# Altium footprint library JL_PCB.PCBLIB: 1112 footprints (part 9 of 71)
Each footprint in its own frame and in the unit in brackets; x right, y up, seen from the top. Pads: shape width x height; smd on the part's side, far side on the other; paste and mask are expansions set on the pad; w line width, h text height; cw(c..) or ccw(c..) is an arc to the next point about the centre after c.
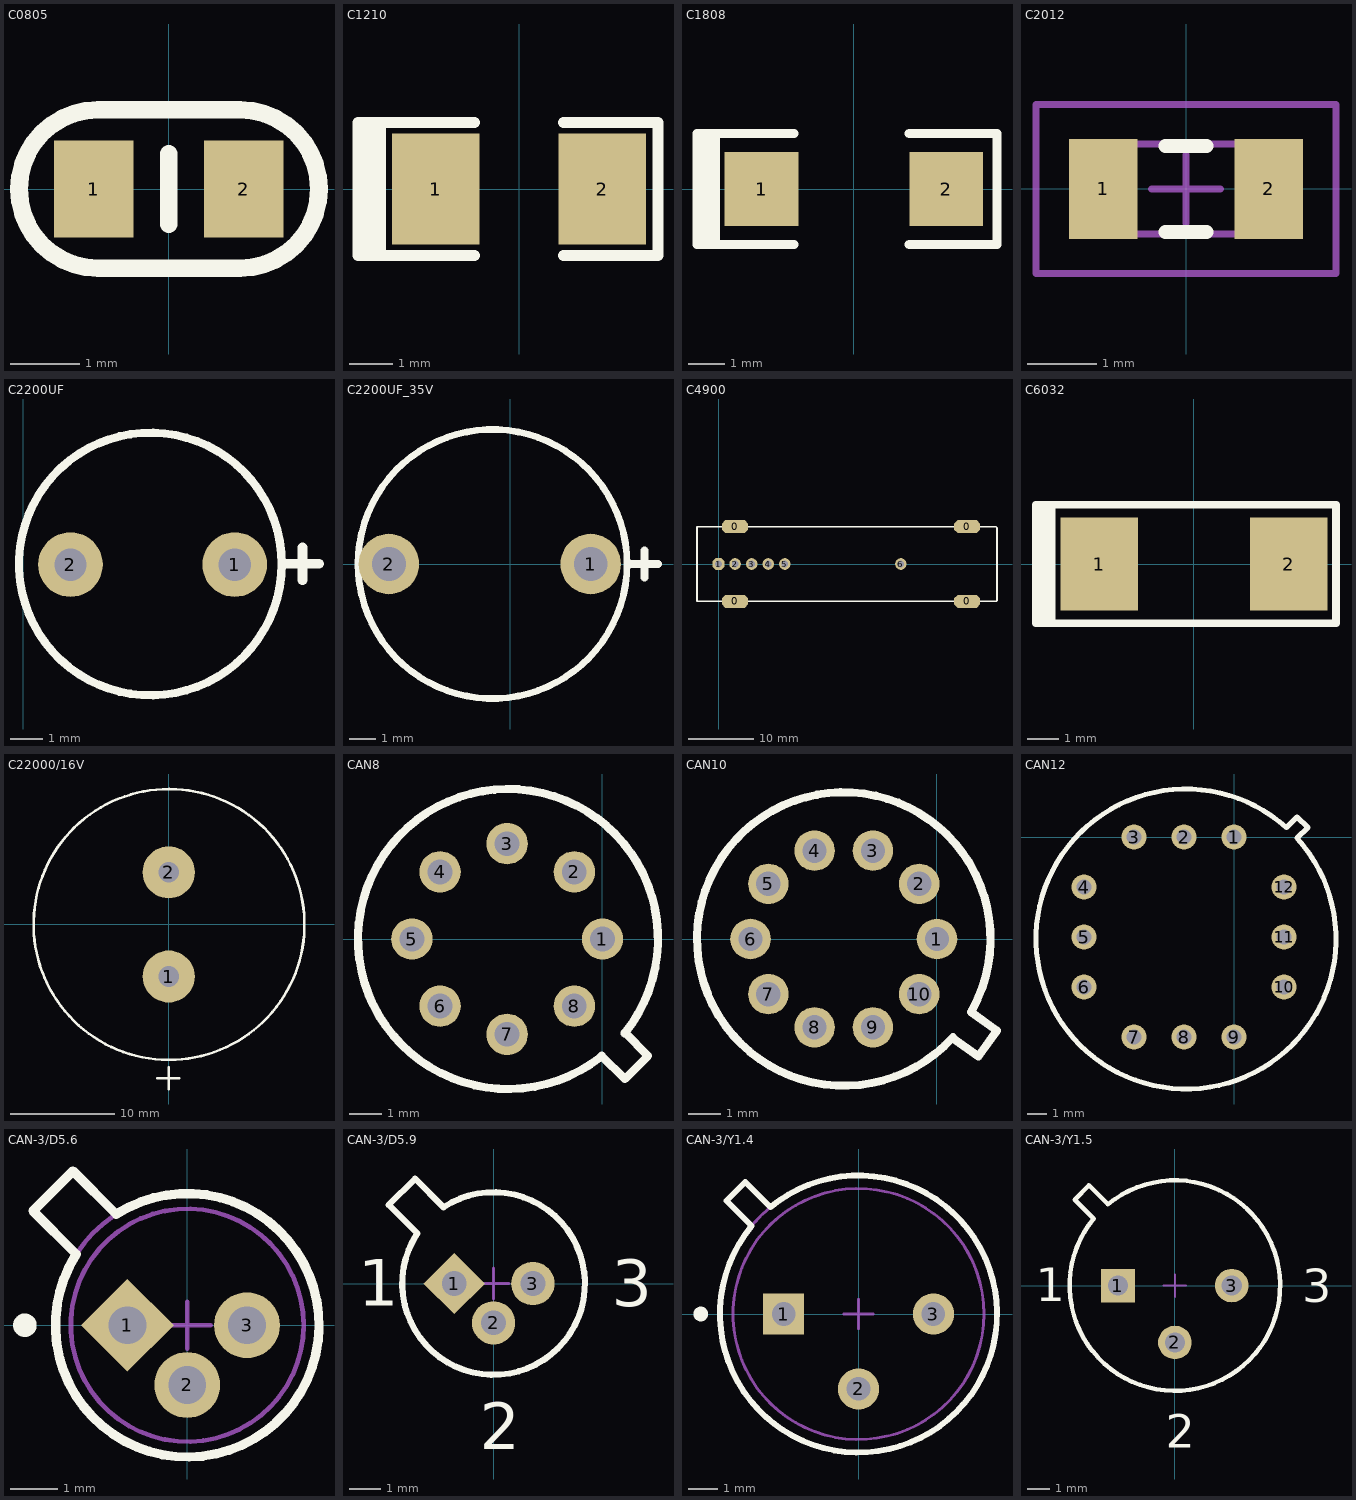
[diagram p8: the footprints below, top view; thin cyan lines are the x and y axes]

## C0805 [mil]
pads (2):
  rect 45x55 smd: 1(-42.5,0) 2(42.5,0)
TopOverlay:
  lines w10: 0,-20 0,20 ; -40,-45 cw(c-40,0) -40,45 40.25,45 cw(c40.25,0) 40.25,-45 -40,-45

## C1210 [mm]
pads (2):
  rect 2x2.54 smd: 1(-1.905,0) 2(1.905,0)
TopOverlay:
  lines w0.254: -3.429,-1.524 -3.429,1.524 ; -3.175,-1.524 -3.175,1.524 ; -1.016,-1.524 -3.683,-1.524 -3.683,1.524 -1.016,1.524 ; 1.016,-1.524 3.175,-1.524 3.175,1.524 1.016,1.524

## C1808 [mil]
pads (2):
  rect 80x80 smd: 1(-100,0) 2(100,0)
TopOverlay:
  lines w10: -160,-60 -160,60 ; -150,-55 -150,60 ; -65,-60 -170,-60 -170,60 -65,60 ; 60,-60 155,-60 155,60 60,60

## C2012 [mm] "Chip Capacitor, 2-Leads, Body 2.0x1.2mm, IPC Low Density"
height 0.6
pads (2):
  rect 1x1.45 smd: 1(-1.2,0) 2(1.2,0)
TopOverlay:
  lines w0.2: -0.3,-0.625 0.3,-0.625 ; -0.3,0.625 0.3,0.625
Mechanical13:
  lines w0.1: -1.05,-0.65 1.05,-0.65 1.05,0.65 -1.05,0.65 -1.05,-0.65
Mechanical15:
  lines w0.1: -0.5,0 0.5,0 ; 0,-0.5 0,0.5 ; -2.175,-1.225 2.175,-1.225 2.175,1.225 -2.175,1.225 -2.175,-1.225
3D body "C0805.STEP": height 0.5, standoff 0, extent -0.984,-0.6 1.016,0.6

## C2200UF [mm]
pads (2):
  round 2 hole 1: 1(6.54,-6.63) 2(1.46,-6.63)
TopOverlay:
  circle w0.254: c3.929,-6.61 r4.061
  lines w0.305: 8.128,-6.604 9.144,-6.604 ; 8.636,-7.112 8.636,-6.096
3D body "User Library-Capacitor, Al El, Thru Mt, 2200uF, 25V - CDE #SEK222M025ST.step": height 25.42, standoff -28.73, extent -2.608,-13.179 10.592,0.021

## C2200UF_35V [mil]
pads (2):
  round 90 hole 50: 1(120,0) 2(-180,0)
TopOverlay:
  circle w10: c-26,0 r200
  lines w12: 180,0 220,0 ; 200,-20 200,20
3D body "User Library-Capacitor, Al El, Thru Mt, 2200uF, 25V - CDE #SEK222M025ST.step": height 1000.6, standoff -1131.29, extent -284.84,-253.69 234.84,266

## C4900 [mil]
pads (10):
  oct 157.48x78.74 smd: 0(100,-225) 0(100,225) 0(1500,-225) 0(1500,225)
  oct 70x70 hole 40: 1(0,0)
  round 70 hole 40: 2(100,0) 3(200,0) 4(300,0) 5(400,0) 6(1100,0)
TopOverlay:
  lines w10: 1675,225 -130,225 -130,-225 1675,-225 1680,-220 1680,218.98

## C6032 [mm]
pads (2):
  rect 2.5x3 smd: 1(-3.048,0) 2(3.048,0)
TopOverlay:
  lines w0.254: -4.826,1.905 -4.826,-1.905 -4.572,-1.905 ; -4.572,-1.905 4.572,-1.905 4.572,1.905 -4.572,1.905 ; -4.572,-1.905 -4.572,1.905 ; -4.572,-1.905 -5.08,-1.905 -5.08,1.905 -4.572,1.905

## C22000/16V [mm]
pads (2):
  round 5 hole 2: 1(0,-5.004) 2(0,5.004)
TopOverlay:
  lines w0.254: -1.118,-14.757 1.016,-14.757 ; -0.051,-13.005 cw(c0.025,0) 0.025,-13.005 ; 0,-15.799 0,-13.741

## CAN8 [mil]
pads (8):
  round 50 hole 30: 1(0,0) 2(-34,81) 3(-115,115) 4(-196,81) 5(-230,0) 6(-196,-81) 7(-115,-115) 8(-34,-81)
TopOverlay:
  lines w10: -2.57,-142.63 cw(c-114,0) 26.66,-113.91 ; -1,-141 27,-169 55,-141 27,-113

## CAN10 [mil]
pads (10):
  round 50 hole 30: 1(0,0) 2(-22,68) 3(-79,109) 4(-151,109) 5(-208,68) 6(-230,0) 7(-208,-68) 8(-151,-109) 9(-79,-109) 10(-22,-68)
TopOverlay:
  lines w10: 19,-122 51,-145 74,-113 42,-90 ; 19.51,-121.11 cw(c-115,0) 43.31,-87.75

## CAN12 [mil]
pads (12):
  round 50 hole 30: 1(0,0) 2(-100,0) 3(-200,0) 4(-300,-100) 5(-300,-200) 6(-300,-300) 7(-200,-400) 8(-100,-400) 9(0,-400) 10(100,-300) 11(100,-200) 12(100,-100)
TopOverlay:
  lines w10: 104.74,18.94 ccw(c-96,-204) 126.94,-3.26 ; 105,19 126,40 148,19 126,-2

## CAN-3/D5.6 [mm] "Can; 3 Leads; Pin Circle Dia. 2.54 mm"
height 2.67
pads (3):
  rect 1.4x1.4 hole 0.8 rot 45: 1(-1.27,0)
  round 1.4 hole 0.8: 2(0,-1.27) 3(1.27,0)
TopOverlay:
  circle w0.25: c-3.45,0 r0.125
  lines w0.2: -3.277,2.429 -2.429,3.277 -1.51,2.358 cw(c0,0) -2.358,1.51 -3.277,2.429
Mechanical13:
  circle w0.1: c0,0 r2.475
  circle w0.1: c0,0 r2.8
Mechanical15:
  lines w0.1: -0.5,0 0.5,0 ; 0,-0.5 0,0.5
3D body: height 2.67, standoff 0.76, extent -2.474,-2.474 2.474,2.474
3D body: height 0.76, standoff 0, extent -2.799,-2.799 2.799,2.799

## CAN-3/D5.9 [mm] "Can; 3 Leads; Pin Circle Dia. 2.54 mm; Lead Dia. 0.48 mm (max)"
height 5.33
pads (3):
  rect 1.4x1.4 hole 0.8 rot 45: 1(-1.27,0)
  round 1.4 hole 0.8: 2(0,-1.27) 3(1.27,0)
TopOverlay:
  lines w0.2: -3.386,2.537 -2.467,1.618 ccw(c0,0) -1.618,2.467 -2.537,3.386 -3.386,2.537
  text "3" at 3.812,-0.742 h1.5
  text "2" at -0.443,-5.355 h1.5
  text "1" at -4.38,-0.719 h1.5
Mechanical15:
  lines w0.1: -0.5,0 0.5,0 ; 0,-0.5 0,0.5

## CAN-3/Y1.4 [mm] "Can; 3 Leads; Pin Circle Dia. 5.08 mm; Lead Dia. 0.48 mm (max)"
height 4.55
pads (3):
  rect 1.4x1.4 hole 0.8: 1(-2.54,0)
  round 1.4 hole 0.8: 2(0,-2.54) 3(2.54,0)
TopOverlay:
  circle w0.25: c-5.35,0 r0.125
  lines w0.2: -3.626,2.99 -4.475,3.838 -3.838,4.475 -2.99,3.626 ; -3.622,2.987 ccw(c0,0) -2.987,3.622
Mechanical13:
  circle w0.1: c0,0 r4.695
  circle w0.1: c0,0 r4.255
Mechanical15:
  lines w0.1: -0.5,0 0.5,0 ; 0,-0.5 0,0.5
3D body: height 1.27, standoff 0, extent -4.694,-4.694 4.694,4.694
3D body: height 4.55, standoff 1.27, extent -4.254,-4.254 4.254,4.254

## CAN-3/Y1.5 [mm] "Can; 3 Leads; Pin Circle Dia. 5.08 mm; Lead Dia. 0.53 mm (max)"
height 4.57
pads (3):
  rect 1.5x1.5 hole 0.9: 1(-2.54,0)
  round 1.5 hole 0.9: 2(0,-2.54) 3(2.54,0)
TopOverlay:
  lines w0.2: -4.475,3.838 -3.838,4.475 -2.99,3.626 cw(c0,0) -3.626,2.99 -4.475,3.838
  text "3" at 5.694,-0.751 h1.5
  text "2" at -0.415,-7.238 h1.5
  text "1" at -6.201,-0.697 h1.5
Mechanical15:
  lines w0.1: -0.5,0 0.5,0 ; 0,-0.5 0,0.5